# Altium footprint library 逸芬的库鸭.PcbLib: 255 footprints (part 7 of 20)
Each footprint in its own frame and in the unit in brackets; x right, y up, seen from the top. Pads: shape width x height; smd on the part's side, far side on the other; paste and mask are expansions set on the pad; w line width, h text height; cw(c..) or ccw(c..) is an arc to the next point about the centre after c.
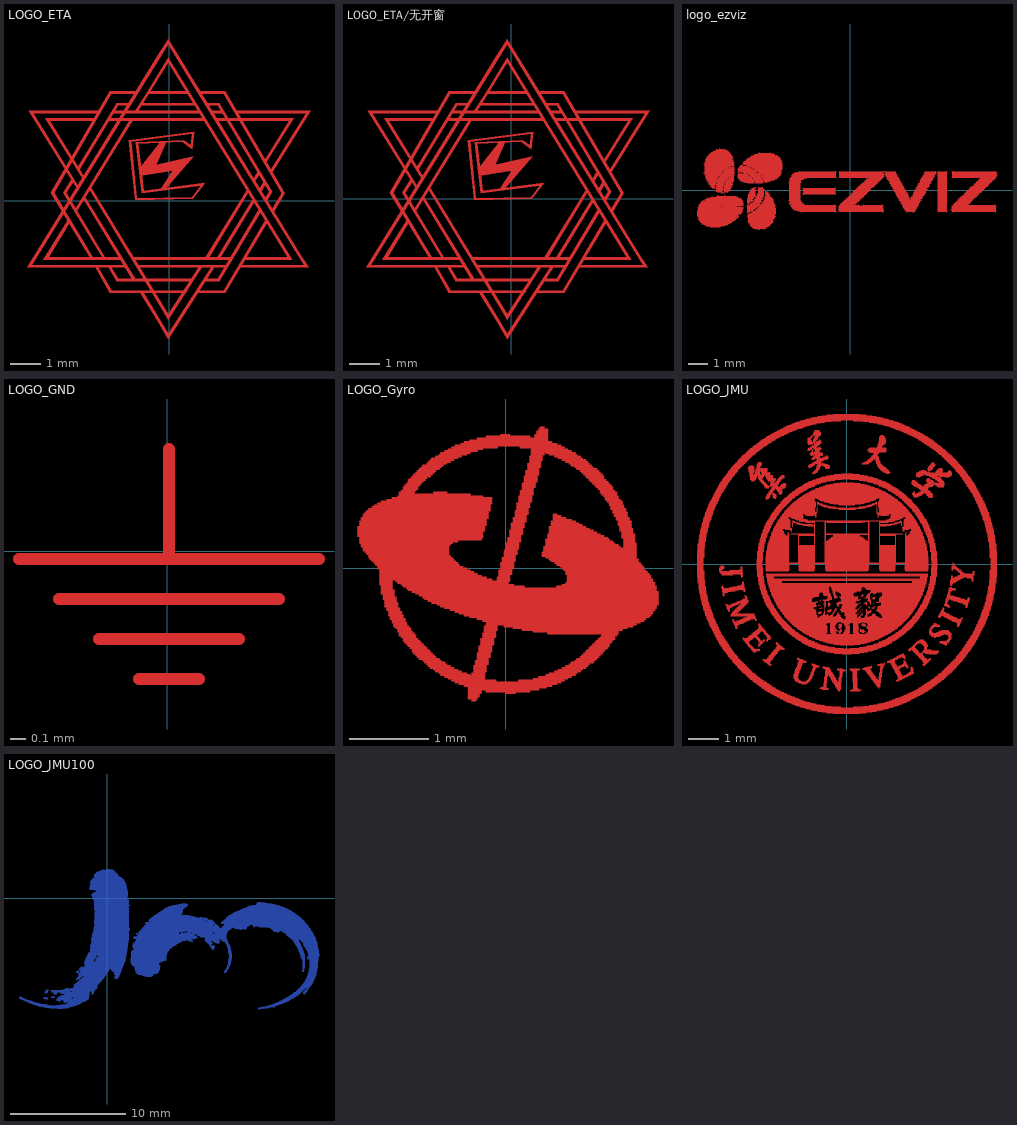
[diagram p6: the footprints below, top view; thin cyan lines are the x and y axes]

## LOGO_ETA [mm]
Top Layer:
  region: -0.307,1.911 -0.961,1.079 -0.917,0.832 0.124,0.984 -0.282,0.374 -0.13,0.374 0.81,1.467 -0.422,1.187 -0.092,1.949
  region: -0.028,5.327 -0.307,4.896 -4.676,-2.191 -4.473,-2.191 -1.45,-2.192 -1.4,-2.115 -1.568,-1.834 -1.654,-1.861 -3.965,-1.861 -3.279,-0.743 -3.33,-0.642 -4.143,-1.937 -1.603,-1.937 -1.488,-2.115 -4.524,-2.115 -0.028,5.15 1.344,2.914 4.442,-2.115 2.41,-2.115 2.36,-2.191 4.595,-2.191 4.341,-1.785
  region: -1.12,2.965 -0.765,3.499 -0.028,4.718 4.061,-1.937 2.512,-1.937 2.563,-1.861 3.909,-1.861 -0.028,4.565 -1.019,2.965
  region: 1.242,3.219 1.648,3.219 3.401,0.298 3.223,-0.007 3.172,0.095 3.299,0.298 1.598,3.143 1.293,3.143
  region: -1.171,-1.861 0.607,-1.861 2.029,-1.861 2.004,-1.937 -1.171,-1.937
  region: -1.019,-2.115 0.759,-2.115 1.928,-2.115 1.902,-2.191 -1.019,-2.191
  region: -1.679,-2.572 -0.612,-2.572 0.81,-2.572 0.785,-2.648 -1.73,-2.648 -2.009,-2.166 -1.908,-2.191
  region: 1.013,3.6 1.852,3.6 3.807,0.247 3.426,-0.388 3.376,-0.286 3.706,0.247 1.801,3.524 1.013,3.524
  region: -1.095,3.6 -1.957,3.6 -3.889,0.273 -2.58,-1.909 -2.517,-1.861 -3.787,0.273 -1.908,3.524 -1.095,3.524
  region: -2.314,2.965 -4.625,2.965 -3.025,0.4 -2.974,0.451 -4.473,2.889 -2.365,2.889
  region: -2.428,2.711 -4.079,2.711 -2.847,0.73 -2.771,0.755 -3.927,2.635 -2.517,2.635
  region: -1.298,2.66 -3.089,-0.273 -3.038,-0.349 -1.196,2.66
  region: 2.588,0.4 1.191,-1.873 1.217,-1.912 1.318,-1.861 2.639,0.324
  region: 2.791,0.095 1.572,-1.886 1.674,-1.912 2.842,0.019
  region: 2.966,-0.266 1.598,-2.572 1.217,-2.572 1.191,-2.648 1.648,-2.648 3.045,-0.311
  region: 3.198,-0.591 1.801,-2.953 0.963,-2.953 0.912,-3.029 1.852,-3.029 3.249,-0.692
  region: -3.178,0.654 -3.193,0.746 -3.482,0.273 -2.173,-1.909 -2.111,-1.861 -3.381,0.273 -3.119,0.671
  region: -1.895,-2.953 -0.828,-2.953 0.594,-2.953 0.569,-3.029 -1.946,-3.029 -2.454,-2.14 -2.352,-2.166
  region: -0.942,-3.029 -0.333,-4.02 -0.021,-4.549 1.521,-2.14 1.42,-2.14 -0.021,-4.375 -0.866,-2.978 -0.942,-3.004
  region: -2.613,0.364 -0.333,-3.385 -0.021,-3.914 1.115,-2.14 1.013,-2.14 -0.021,-3.74 -0.866,-2.343 -2.593,0.476
  region: -2.816,0.06 -1.192,-2.61 -1.108,-2.61 -1.117,-2.57 -2.797,0.171
  region: 0.836,2.279 0.759,1.695 0.429,1.949 0.48,2 0.709,1.822 0.759,2.203 -1.247,1.949 -1.057,0.082 0.759,0.12 1.039,0.501 -0.892,0.247 -1.095,1.924 0.48,2 0.455,1.975 0.429,1.949 -1.019,1.873 -0.841,0.324 1.064,0.578 1.191,0.603 0.785,0.07 -1.12,0.019 -1.323,2
  region: -1.781,2.965 0.988,2.965 0.988,2.94 1.013,2.889 -1.831,2.889
  region: -2.009,2.635 -1.958,2.711 1.115,2.711 1.166,2.635
  region: -0.942,3.219 0.836,3.219 0.81,3.219 0.861,3.194 0.861,3.143 -0.993,3.143
  region: -1.323,3.219 -1.73,3.219 -3.013,1.098 -2.949,1.035 -1.679,3.143 -1.374,3.143
  region: 1.75,2.965 1.394,2.965 1.344,2.914 1.445,2.914 1.471,2.889 1.75,2.889
  region: 1.928,2.711 1.572,2.711 1.521,2.66 1.598,2.635 1.623,2.635 1.648,2.635 1.928,2.635
  region: -0.663,3.6 0.607,3.6 0.632,3.575 0.658,3.549 0.683,3.524 -0.714,3.524
  region: 2.207,2.965 4.646,2.965 4.671,2.965 3.401,0.933 3.337,0.997 4.519,2.889 2.233,2.889
  region: 1.648,2.711 4.087,2.711 4.112,2.711 3.172,1.213 3.147,1.34 3.96,2.635 1.674,2.635
  region: 2.766,0.705 2.918,0.959 2.969,0.908 2.969,0.857 2.842,0.654 2.791,0.654
  region: 2.969,0.374 3.122,0.628 3.172,0.578 3.172,0.527 3.045,0.324 2.995,0.324
  text "协" at 0.201,-1.683 h0.76
  text "电" at -0.739,-1.683 h0.76
  text "大" at 1.115,-0.794 h0.76
  text "集" at -1.552,-0.794 h0.76
Top Solder:
  drawing of 33 lines, arcs and shapes, not listed
  text "协" at 0.201,-1.683 h0.76
  text "电" at -0.739,-1.683 h0.76
  text "大" at 1.115,-0.794 h0.76
  text "集" at -1.552,-0.794 h0.76

## LOGO_ETA/无开窗 [mm]
Top Layer:
  region: -0.409,1.835 -1.063,1.003 -1.019,0.755 0.023,0.908 -0.384,0.298 -0.231,0.298 0.709,1.39 -0.523,1.111 -0.193,1.873
  region: -0.13,5.251 -0.409,4.819 -4.778,-2.267 -4.575,-2.267 -1.552,-2.269 -1.501,-2.191 -1.67,-1.91 -1.755,-1.937 -4.067,-1.937 -3.381,-0.819 -3.432,-0.718 -4.244,-2.013 -1.704,-2.013 -1.59,-2.191 -4.625,-2.191 -0.13,5.073 1.242,2.838 4.341,-2.191 2.309,-2.191 2.258,-2.267 4.493,-2.267 4.239,-1.861
  region: -1.222,2.889 -0.866,3.422 -0.13,4.642 3.96,-2.013 2.41,-2.013 2.461,-1.937 3.807,-1.937 -0.13,4.489 -1.12,2.889
  region: 1.14,3.143 1.547,3.143 3.299,0.222 3.122,-0.083 3.071,0.019 3.198,0.222 1.496,3.067 1.191,3.067
  region: -1.273,-1.937 0.505,-1.937 1.928,-1.937 1.902,-2.013 -1.273,-2.013
  region: -1.12,-2.191 0.658,-2.191 1.826,-2.191 1.801,-2.267 -1.12,-2.267
  region: -1.781,-2.648 -0.714,-2.648 0.709,-2.648 0.683,-2.724 -1.831,-2.724 -2.111,-2.242 -2.009,-2.267
  region: 0.912,3.524 1.75,3.524 3.706,0.171 3.325,-0.464 3.274,-0.362 3.604,0.171 1.699,3.448 0.912,3.448
  region: -1.196,3.524 -2.058,3.524 -3.99,0.197 -2.681,-1.986 -2.619,-1.937 -3.889,0.197 -2.009,3.448 -1.196,3.448
  region: -2.416,2.889 -4.727,2.889 -3.127,0.324 -3.076,0.374 -4.575,2.813 -2.466,2.813
  region: -2.53,2.635 -4.181,2.635 -2.949,0.654 -2.873,0.679 -4.029,2.559 -2.619,2.559
  region: -1.4,2.584 -3.19,-0.349 -3.14,-0.426 -1.298,2.584
  region: 2.487,0.324 1.09,-1.95 1.115,-1.988 1.217,-1.937 2.537,0.247
  region: 2.69,0.019 1.471,-1.962 1.572,-1.988 2.741,-0.057
  region: 2.864,-0.342 1.496,-2.648 1.115,-2.648 1.09,-2.724 1.547,-2.724 2.944,-0.388
  region: 3.096,-0.667 1.699,-3.029 0.861,-3.029 0.81,-3.105 1.75,-3.105 3.147,-0.769
  region: -3.279,0.578 -3.295,0.669 -3.584,0.197 -2.275,-1.986 -2.212,-1.937 -3.482,0.197 -3.221,0.595
  region: -1.997,-3.029 -0.93,-3.029 0.493,-3.029 0.467,-3.105 -2.047,-3.105 -2.555,-2.216 -2.454,-2.242
  region: -1.044,-3.105 -0.434,-4.096 -0.122,-4.625 1.42,-2.216 1.318,-2.216 -0.122,-4.452 -0.968,-3.055 -1.044,-3.08
  region: -2.714,0.288 -0.434,-3.461 -0.122,-3.99 1.013,-2.216 0.912,-2.216 -0.122,-3.817 -0.968,-2.42 -2.695,0.4
  region: -2.917,-0.017 -1.294,-2.686 -1.209,-2.686 -1.219,-2.646 -2.898,0.095
  region: 0.734,2.203 0.658,1.619 0.328,1.873 0.378,1.924 0.607,1.746 0.658,2.127 -1.349,1.873 -1.158,0.006 0.658,0.044 0.937,0.425 -0.993,0.171 -1.196,1.848 0.378,1.924 0.353,1.898 0.328,1.873 -1.12,1.797 -0.942,0.247 0.963,0.501 1.09,0.527 0.683,-0.007 -1.222,-0.057 -1.425,1.924
  region: -1.882,2.889 0.886,2.889 0.886,2.864 0.912,2.813 -1.933,2.813
  region: -2.111,2.559 -2.06,2.635 1.013,2.635 1.064,2.559
  region: -1.044,3.143 0.734,3.143 0.709,3.143 0.759,3.118 0.759,3.067 -1.095,3.067
  region: -1.425,3.143 -1.831,3.143 -3.114,1.022 -3.051,0.959 -1.781,3.067 -1.476,3.067
  region: 1.648,2.889 1.293,2.889 1.242,2.838 1.344,2.838 1.369,2.813 1.648,2.813
  region: 1.826,2.635 1.471,2.635 1.42,2.584 1.496,2.559 1.521,2.559 1.547,2.559 1.826,2.559
  region: -0.765,3.524 0.505,3.524 0.531,3.499 0.556,3.473 0.582,3.448 -0.815,3.448
  region: 2.106,2.889 4.544,2.889 4.569,2.889 3.299,0.857 3.236,0.921 4.417,2.813 2.131,2.813
  region: 1.547,2.635 3.985,2.635 4.011,2.635 3.071,1.136 3.045,1.263 3.858,2.559 1.572,2.559
  region: 2.664,0.628 2.817,0.882 2.868,0.832 2.868,0.781 2.741,0.578 2.69,0.578
  region: 2.868,0.298 3.02,0.552 3.071,0.501 3.071,0.451 2.944,0.247 2.893,0.247
  text "协" at 0.099,-1.759 h0.76
  text "电" at -0.841,-1.759 h0.76
  text "大" at 1.013,-0.87 h0.76
  text "集" at -1.654,-0.87 h0.76

## logo_ezviz [mm]
Top Layer:
  drawing of 2358 lines, arcs and shapes, not listed

## LOGO_GND [mm]
Top Layer:
  lines w0.076: -0.94,-0.051 0.965,-0.051 ; -0.686,-0.305 0.711,-0.305 ; -0.432,-0.559 0.457,-0.559 ; -0.178,-0.813 0.203,-0.813 ; 0.013,-0.051 0.013,0.648

## LOGO_Gyro [mm]
Top Layer:
  lines w0.023: -1.872,0.409 -0.295,0.409 ; -1.872,0.432 -0.295,0.432 ; -1.872,0.455 -0.295,0.455 ; -1.872,0.478 -0.272,0.478 ; -1.872,0.5 -0.272,0.5 ; -1.872,0.523 -0.272,0.523 ; -1.849,0.318 -0.683,0.318 ; -1.849,0.34 -0.615,0.34 ; -1.849,0.363 -0.318,0.363 ; -1.849,0.386 -0.295,0.386 ; -1.849,0.546 -0.249,0.546 ; -1.849,0.569 -0.249,0.569 ; -1.849,0.592 -0.249,0.592 ; -1.826,0.272 -0.729,0.272 ; -1.826,0.295 -0.706,0.295 ; -1.826,0.615 -0.249,0.615 ; -1.826,0.638 -0.226,0.638 ; -1.803,0.226 -0.729,0.226 ; -1.803,0.249 -0.729,0.249 ; -1.803,0.66 -0.226,0.66 ; -1.803,0.683 -0.226,0.683 ; -1.781,0.203 -0.729,0.203 ; -1.781,0.706 -0.226,0.706 ; -1.758,0.18 -0.729,0.18 ; -1.758,0.729 -0.203,0.729 ; -1.735,0.135 -0.683,0.135 ; -1.735,0.157 -0.706,0.157 ; -1.735,0.752 -0.203,0.752 ; -1.712,0.112 -0.66,0.112 ; -1.689,0.089 -0.638,0.089 ; -1.689,0.775 -0.203,0.775 ; -1.666,0.066 -0.615,0.066 ; -1.666,0.798 -0.203,0.798 ; -1.643,0.043 -0.592,0.043 ; -1.621,-0.003 -0.5,-0.003 ; -1.621,0.02 -0.546,0.02 ; -1.621,0.82 -0.18,0.82 ; -1.598,-0.208 -1.438,-0.208 ; -1.598,-0.185 -1.438,-0.185 ; -1.598,-0.163 -1.438,-0.163 ; -1.598,-0.14 -0.18,-0.14 ; -1.598,-0.117 -0.249,-0.117 ; -1.598,-0.094 -0.318,-0.094 ; -1.598,-0.071 -0.363,-0.071 ; -1.598,-0.048 -0.409,-0.048 ; -1.598,-0.025 -0.455,-0.025 ; -1.575,-0.323 -1.415,-0.323 ; -1.575,-0.3 -1.415,-0.3 ; -1.575,-0.277 -1.415,-0.277 ; -1.575,-0.254 -1.438,-0.254 ; -1.575,-0.231 -1.438,-0.231 ; -1.575,0.843 -0.18,0.843 ; -1.552,-0.391 -1.392,-0.391 ; -1.552,-0.368 -1.392,-0.368 ; -1.552,-0.345 -1.415,-0.345 ; -1.529,-0.483 -1.369,-0.483 ; -1.529,-0.46 -1.369,-0.46 ; -1.529,-0.437 -1.369,-0.437 ; -1.529,-0.414 -1.392,-0.414 ; -1.506,-0.528 -1.346,-0.528 ; -1.506,-0.505 -1.346,-0.505 ; -1.506,0.866 -0.18,0.866 ; -1.483,-0.597 -1.3,-0.597 ; -1.483,-0.574 -1.323,-0.574 ; -1.483,-0.551 -1.323,-0.551 ; -1.46,-0.643 -1.278,-0.643 ; -1.46,-0.62 -1.3,-0.62 ; -1.438,-0.688 -1.255,-0.688 ; -1.438,-0.665 -1.278,-0.665 ; -1.438,0.889 -0.18,0.889 ; -1.415,-0.734 -1.232,-0.734 ; -1.415,-0.711 -1.255,-0.711 ; -1.392,-0.757 -1.209,-0.757 ; -1.392,-0.163 0.048,-0.163 ; -1.369,-0.803 -1.186,-0.803 ; -1.369,-0.78 -1.209,-0.78 ; -1.369,-0.185 0.025,-0.185 ; -1.369,0.912 -0.295,0.912 ; -1.346,-0.848 -1.14,-0.848 ; -1.346,-0.826 -1.163,-0.826 ; -1.346,0.935 -0.455,0.935 ; -1.346,0.958 -1.163,0.958 ; -1.323,-0.871 -1.14,-0.871 ; -1.323,-0.208 0.094,-0.208 ; -1.323,0.98 -1.14,0.98 ; -1.3,-0.917 -1.095,-0.917 ; -1.3,-0.894 -1.118,-0.894 ; -1.3,-0.231 0.231,-0.231 ; -1.3,1.003 -1.118,1.003 ; -1.3,1.026 -1.118,1.026 ; -1.278,-0.94 -1.072,-0.94 ; -1.278,1.049 -1.095,1.049 ; -1.255,-0.963 -1.049,-0.963 ; -1.255,-0.254 1.9,-0.254 ; -1.255,1.072 -1.072,1.072 ; -1.232,-0.986 -1.026,-0.986 ; -1.232,-0.277 1.9,-0.277 ; -1.232,1.095 -1.049,1.095 ; -1.232,1.118 -1.026,1.118 ; -1.209,-1.008 -1.003,-1.008 ; -1.209,1.14 -1.003,1.14 ; -1.186,-1.054 -0.958,-1.054 ; -1.186,-1.031 -0.98,-1.031 ; -1.186,-0.3 1.923,-0.3 ; -1.186,1.163 -0.958,1.163 ; -1.163,-1.077 -0.935,-1.077 ; -1.163,1.186 -0.935,1.186 ; -1.14,-1.1 -0.912,-1.1 ; -1.14,-0.323 1.923,-0.323 ; -1.14,1.209 -0.912,1.209 ; -1.118,-1.123 -0.889,-1.123 ; -1.118,1.232 -0.889,1.232 ; -1.095,-1.146 -0.843,-1.146 ; -1.095,-0.345 1.923,-0.345 ; -1.095,1.255 -0.843,1.255 ; -1.072,1.278 -0.82,1.278 ; -1.049,-1.168 -0.82,-1.168 ; -1.049,-0.368 1.923,-0.368 ; -1.049,1.3 -0.798,1.3 ; -1.026,-1.191 -0.775,-1.191 ; -1.026,-0.391 1.923,-0.391 ; -1.003,-1.214 -0.752,-1.214 ; -1.003,1.323 -0.752,1.323 ; -0.98,-1.237 -0.706,-1.237 ; -0.98,-0.414 1.923,-0.414 ; -0.98,1.346 -0.706,1.346 ; -0.958,-1.26 -0.66,-1.26 ; -0.958,1.369 -0.66,1.369 ; -0.935,-0.437 1.923,-0.437 ; -0.935,1.392 -0.615,1.392 ; -0.912,-1.283 -0.615,-1.283 ; -0.912,0.958 -0.752,0.958 ; -0.889,-1.306 -0.569,-1.306 ; -0.889,1.415 -0.569,1.415 ; -0.866,-0.46 1.923,-0.46 ; -0.843,-1.328 -0.5,-1.328 ; -0.843,1.438 -0.5,1.438 ; -0.82,-1.351 -0.455,-1.351 ; -0.82,-0.483 1.9,-0.483 ; -0.82,1.46 -0.455,1.46 ; -0.775,-1.374 -0.272,-1.374 ; -0.775,-0.505 1.9,-0.505 ; -0.775,1.483 -0.363,1.483 ; -0.729,-1.397 -0.272,-1.397 ; -0.729,1.506 -0.295,1.506 ; -0.706,-0.528 1.877,-0.528 ; -0.683,-1.42 -0.135,-1.42 ; -0.683,1.529 -0.112,1.529 ; -0.638,-1.443 0.688,-1.443 ; -0.638,-0.551 1.854,-0.551 ; -0.638,1.552 0.688,1.552 ; -0.592,-1.466 0.643,-1.466 ; -0.592,-0.574 1.854,-0.574 ; -0.569,1.575 0.643,1.575 ; -0.523,-1.488 0.574,-1.488 ; -0.523,-0.597 1.831,-0.597 ; -0.523,1.598 0.574,1.598 ; -0.478,-1.648 -0.363,-1.648 ; -0.478,-1.626 -0.34,-1.626 ; -0.478,-1.603 -0.34,-1.603 ; -0.478,-1.58 -0.318,-1.58 ; -0.478,-1.557 -0.318,-1.557 ; -0.478,-1.534 0.414,-1.534 ; -0.478,-1.511 0.505,-1.511 ; -0.455,-0.62 1.808,-0.62 ; -0.455,1.621 0.528,1.621 ; -0.432,-1.671 -0.386,-1.671 ; -0.432,-1.351 -0.272,-1.351 ; -0.432,-1.328 -0.272,-1.328 ; -0.409,-1.306 -0.249,-1.306 ; -0.409,-1.283 -0.249,-1.283 ; -0.409,-1.26 -0.249,-1.26 ; -0.409,-1.237 -0.249,-1.237 ; -0.386,-1.214 -0.226,-1.214 ; -0.386,-1.191 -0.226,-1.191 ; -0.386,-1.168 -0.226,-1.168 ; -0.363,-1.146 -0.226,-1.146 ; -0.363,-1.123 -0.203,-1.123 ; -0.363,-1.1 -0.203,-1.1 ; -0.363,-1.077 -0.203,-1.077 ; -0.363,-0.643 1.763,-0.643 ; -0.363,1.643 0.528,1.643 ; -0.34,-1.054 -0.18,-1.054 ; -0.34,-1.031 -0.18,-1.031 ; -0.34,-1.008 -0.18,-1.008 ; -0.34,-0.986 -0.18,-0.986 ; -0.318,-0.963 -0.157,-0.963 ; -0.318,-0.94 -0.157,-0.94 ; -0.318,-0.917 -0.157,-0.917 ; -0.318,-0.894 -0.157,-0.894 ; -0.295,-0.871 -0.135,-0.871 ; -0.295,-0.848 -0.135,-0.848 ; -0.295,-0.826 -0.135,-0.826 ; -0.295,-0.665 1.74,-0.665 ; -0.272,-0.803 -0.135,-0.803 ; -0.272,-0.78 -0.112,-0.78 ; -0.272,-0.757 -0.112,-0.757 ; -0.272,-0.734 -0.112,-0.734 ; -0.249,-1.557 0.3,-1.557 ; -0.249,-0.711 1.648,-0.711 ; -0.249,-0.688 1.694,-0.688 ; -0.249,1.666 0.3,1.666 ; -0.112,-0.14 0.048,-0.14 ; -0.112,-0.117 0.048,-0.117 ; -0.089,-0.094 0.048,-0.094 ; -0.089,-0.071 0.071,-0.071 ; -0.089,-0.048 0.071,-0.048 ; -0.089,-0.025 0.071,-0.025 ; -0.066,-0.003 0.094,-0.003 ; -0.066,0.02 0.094,0.02 ; -0.066,0.043 0.094,0.043 ; -0.066,0.066 0.094,0.066 ; -0.066,1.689 0.048,1.689 ; -0.043,0.089 0.117,0.089 ; -0.043,0.112 0.117,0.112 ; -0.043,0.135 0.117,0.135 ; -0.02,-0.734 1.603,-0.734 ; -0.02,0.157 0.117,0.157 ; -0.02,0.18 0.14,0.18 ; -0.02,0.203 0.14,0.203 ; -0.02,0.226 0.14,0.226 ; 0.003,-1.58 0.117,-1.58 ; 0.003,0.249 0.163,0.249 ; 0.003,0.272 0.163,0.272 ; 0.003,0.295 0.163,0.295 ; 0.003,0.318 0.163,0.318 ; 0.025,0.34 0.185,0.34 ; 0.025,0.363 0.185,0.363 ; 0.025,0.386 0.185,0.386 ; 0.048,0.409 0.185,0.409 ; 0.048,0.432 0.208,0.432 ; 0.048,0.455 0.208,0.455 ; 0.048,0.478 0.208,0.478 ; 0.071,0.5 0.208,0.5 ; 0.071,0.523 0.231,0.523 ; 0.071,0.546 0.231,0.546 ; 0.071,0.569 0.231,0.569 ; 0.094,-0.757 1.534,-0.757 ; 0.094,0.592 0.254,0.592 ; 0.094,0.615 0.254,0.615 ; 0.094,0.638 0.254,0.638 ; 0.117,0.66 0.254,0.66 ; 0.117,0.683 0.277,0.683 ; 0.117,0.706 0.277,0.706 ; 0.117,0.729 0.277,0.729 ; 0.14,0.752 0.277,0.752 ; 0.14,0.775 0.3,0.775 ; 0.14,0.798 0.3,0.798 ; 0.14,0.82 0.3,0.82 ; 0.163,-1.42 0.734,-1.42 ; 0.163,0.843 0.323,0.843 ; 0.163,0.866 0.323,0.866 ; 0.163,0.889 0.323,0.889 ; 0.163,0.912 0.323,0.912 ; 0.185,0.935 0.345,0.935 ; 0.185,0.958 0.345,0.958 ; 0.185,0.98 0.345,0.98 ; 0.185,1.529 0.734,1.529 ; 0.208,-0.78 1.466,-0.78 ; 0.208,1.003 0.345,1.003 ; 0.208,1.026 0.368,1.026 ; 0.208,1.049 0.368,1.049 ; 0.208,1.072 0.368,1.072 ; 0.231,1.095 0.391,1.095 ; 0.231,1.118 0.391,1.118 ; 0.231,1.14 0.391,1.14 ; 0.231,1.163 0.391,1.163 ; 0.254,1.186 0.414,1.186 ; 0.254,1.209 0.414,1.209 ; 0.254,1.232 0.414,1.232 ; 0.277,1.255 0.414,1.255 ; 0.277,1.278 0.437,1.278 ; 0.277,1.3 0.437,1.3 ; 0.277,1.323 0.437,1.323 ; 0.3,1.346 0.437,1.346 ; 0.3,1.369 0.46,1.369 ; 0.3,1.392 0.46,1.392 ; 0.3,1.415 0.46,1.415 ; 0.323,1.438 0.483,1.438 ; 0.323,1.46 0.483,1.46 ; 0.323,1.483 0.826,1.483 ; 0.323,1.506 0.78,1.506 ; 0.345,-1.397 0.78,-1.397 ; 0.345,-0.803 1.42,-0.803 ; 0.368,1.666 0.528,1.666 ; 0.368,1.689 0.528,1.689 ; 0.391,1.712 0.528,1.712 ; 0.391,1.735 0.528,1.735 ; 0.414,-1.374 0.826,-1.374 ; 0.414,1.758 0.528,1.758 ; 0.437,1.781 0.483,1.781 ; 0.46,0.157 1.648,0.157 ; 0.46,0.18 1.648,0.18 ; 0.46,0.203 1.648,0.203 ; 0.483,0.226 1.648,0.226 ; 0.483,0.249 1.648,0.249 ; 0.483,0.272 1.443,0.272 ; 0.505,-1.351 0.871,-1.351 ; 0.505,0.135 1.648,0.135 ; 0.505,0.295 1.42,0.295 ; 0.505,0.318 1.374,0.318 ; 0.505,0.34 1.351,0.34 ; 0.505,0.363 1.306,0.363 ; 0.505,1.46 0.871,1.46 ; 0.528,-0.826 1.42,-0.826 ; 0.528,0.386 1.283,0.386 ; 0.528,0.409 1.237,0.409 ; 0.528,0.432 1.191,0.432 ; 0.551,-1.328 0.894,-1.328 ; 0.551,0.112 1.671,0.112 ; 0.551,0.455 1.146,0.455 ; 0.551,0.478 1.1,0.478 ; 0.551,0.5 1.054,0.5 ; 0.551,0.523 1.008,0.523 ; 0.551,1.438 0.894,1.438 ; 0.574,0.089 1.671,0.089 ; 0.574,0.546 0.963,0.546 ; 0.574,0.569 0.917,0.569 ; 0.574,0.592 0.871,0.592 ; 0.597,0.615 0.826,0.615 ; 0.597,0.638 0.757,0.638 ; 0.597,0.66 0.688,0.66 ; 0.597,0.683 0.643,0.683 ; 0.62,-1.306 0.94,-1.306 ; 0.62,0.066 1.694,0.066 ; 0.62,1.415 0.94,1.415 ; 0.643,-0.231 1.9,-0.231 ; 0.643,0.043 1.717,0.043 ; 0.665,-1.283 0.963,-1.283 ; 0.665,1.392 0.963,1.392 ; 0.688,0.02 1.74,0.02 ; 0.711,-1.26 1.008,-1.26 ; 0.711,-0.208 1.877,-0.208 ; 0.711,-0.003 1.74,-0.003 ; 0.711,1.369 1.008,1.369 ; 0.734,-0.025 1.763,-0.025 ; 0.757,-1.237 1.031,-1.237 ; 0.757,-0.185 1.877,-0.185 ; 0.757,-0.071 1.808,-0.071 ; 0.757,-0.048 1.786,-0.048 ; 0.757,1.346 1.031,1.346 ; 0.78,-0.163 1.854,-0.163 ; 0.78,-0.14 1.854,-0.14 ; 0.78,-0.117 1.831,-0.117 ; 0.78,-0.094 1.831,-0.094 ; 0.803,-1.214 1.054,-1.214 ; 0.803,1.323 1.054,1.323 ; 0.826,-1.191 1.1,-1.191 ; 0.826,1.3 1.077,1.3 ; 0.871,-1.168 1.123,-1.168 ; 0.871,1.278 1.1,1.278 ; 0.894,-1.146 1.146,-1.146 ; 0.894,1.255 1.146,1.255 ; 0.94,-1.123 1.168,-1.123 ; 0.94,1.232 1.168,1.232 ; 0.963,-1.1 1.191,-1.1 ; 0.963,1.209 1.191,1.209 ; 0.986,-1.077 1.214,-1.077 ; 0.986,1.186 1.214,1.186 ; 1.008,-1.054 1.237,-1.054 ; 1.008,1.163 1.237,1.163 ; 1.031,-1.031 1.26,-1.031 ; 1.031,1.14 1.237,1.14 ; 1.054,-1.008 1.283,-1.008 ; 1.054,1.118 1.26,1.118 ; 1.077,-0.986 1.306,-0.986 ; 1.077,1.095 1.283,1.095 ; 1.1,-0.963 1.306,-0.963 ; 1.1,1.072 1.306,1.072 ; 1.123,-0.94 1.328,-0.94 ; 1.123,1.049 1.328,1.049 ; 1.146,-0.917 1.351,-0.917 ; 1.146,1.026 1.351,1.026 ; 1.168,-0.894 1.374,-0.894 ; 1.168,1.003 1.351,1.003 ; 1.191,-0.871 1.374,-0.871 ; 1.191,0.958 1.397,0.958 ; 1.191,0.98 1.374,0.98 ; 1.214,-0.848 1.397,-0.848 ; 1.214,0.935 1.397,0.935 ; 1.237,0.912 1.42,0.912 ; 1.26,0.866 1.443,0.866 ; 1.26,0.889 1.42,0.889 ; 1.283,0.843 1.466,0.843 ; 1.306,0.798 1.488,0.798 ; 1.306,0.82 1.466,0.82 ; 1.328,0.752 1.511,0.752 ; 1.328,0.775 1.488,0.775 ; 1.351,0.706 1.534,0.706 ; 1.351,0.729 1.511,0.729 ; 1.374,0.66 1.534,0.66 ; 1.374,0.683 1.534,0.683 ; 1.397,0.615 1.557,0.615 ; 1.397,0.638 1.557,0.638 ; 1.42,0.546 1.58,0.546 ; 1.42,0.569 1.58,0.569 ; 1.42,0.592 1.58,0.592 ; 1.443,0.478 1.603,0.478 ; 1.443,0.5 1.603,0.5 ; 1.443,0.523 1.58,0.523 ; 1.466,0.386 1.626,0.386 ; 1.466,0.409 1.626,0.409 ; 1.466,0.432 1.626,0.432 ; 1.466,0.455 1.603,0.455 ; 1.488,0.272 1.648,0.272 ; 1.488,0.295 1.648,0.295 ; 1.488,0.318 1.648,0.318 ; 1.488,0.34 1.626,0.34 ; 1.488,0.363 1.626,0.363

## LOGO_JMU [mm]
Top Layer:
  drawing of 32 lines, arcs and shapes, not listed
Top Solder:
  drawing of 32 lines, arcs and shapes, not listed
